# Altium footprint library Capacitors_Semi.PcbLib: 34 footprints (part 3 of 3)
Each footprint in its own frame and in the unit in brackets; x right, y up, seen from the top. Pads: shape width x height; smd on the part's side, far side on the other; paste and mask are expansions set on the pad; w line width, h text height; cw(c..) or ccw(c..) is an arc to the next point about the centre after c.
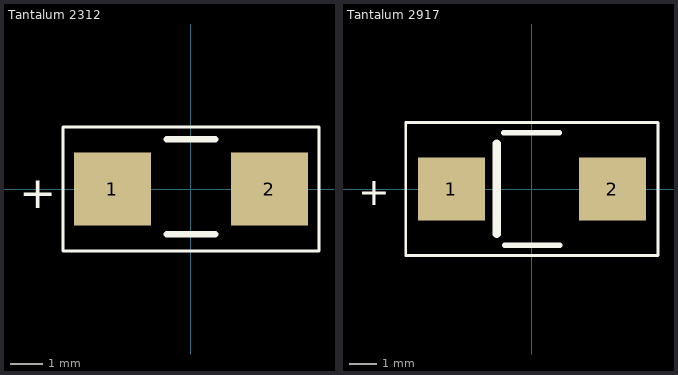
[diagram p2: the footprints below, top view; thin cyan lines are the x and y axes]

## Tantalum 2312 [mm] "Tatalum capacitor 2312"
height 1.35
pads (2):
  rect 2.37x2.23 smd: 1(-2.413,0) 2(2.413,0)
Top Overlay:
  lines w0.1: -3.937,-1.905 3.937,-1.905 3.937,1.905 -3.937,1.905 -3.937,-1.905
  lines w0.2: -0.75,-1.397 0.75,-1.397 ; -0.75,1.524 0.75,1.524
  text "+" at -5.286,-0.587 h1
3D body "C 6032-28.step": height 2.51, standoff 0, extent -3,-1.6 3,1.6

## Tantalum 2917 [mm] "Tatalum capacitor 2917"
height 1.35
pads (2):
  rect 2.43x2.27 smd: 1(-2.921,0) 2(2.921,0)
Top Overlay:
  lines w0.1: -4.572,-2.413 -4.572,2.413 4.572,2.413 4.572,-2.413 -4.572,-2.413
  lines w0.2: -1.016,2.032 0.984,2.032 ; -0.984,-2.032 1.016,-2.032
  lines w0.3: -1.27,-1.635 -1.27,1.651
  text "+" at -6.302,-0.587 h1
3D body "V 7343-20.step": height 1.81, standoff 0, extent -3.65,-2.15 3.65,2.15